# Altium schematic symbol library AD_Lib.SchLib: 1239 symbols (part 6 of 9) (continued)
## Q_BCX70K (continued)
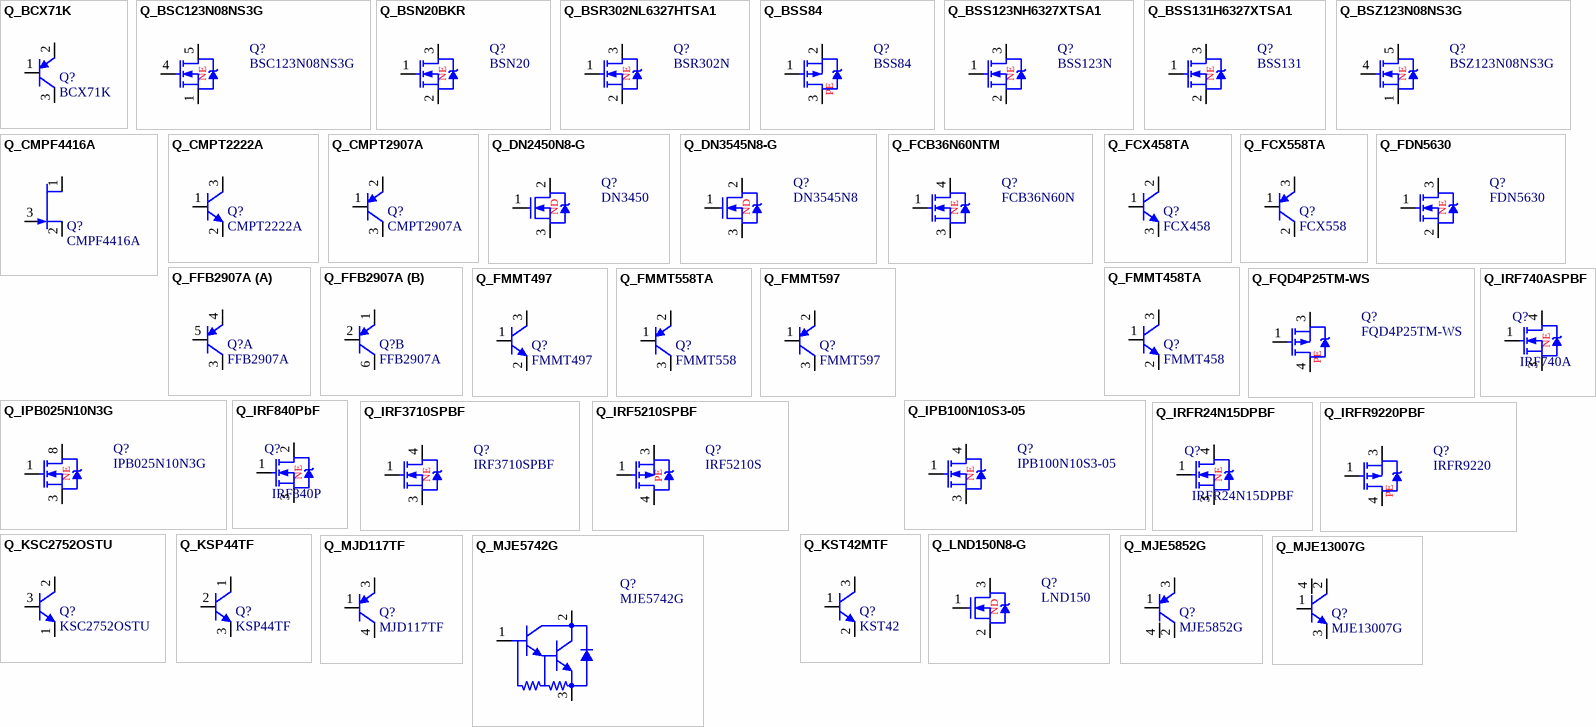
[diagram p27: symbols Q_BCX71K to Q_MJE13007G]

## Q_BCX71K
designator Q?, comment BCX71K
Èý¼«¹Ü,PNP,0.5A,45V; Manufacturer: Fairchild; pro-environment: RoHS; Quality: -55~150¡æ; SN: 03.4.22.17.51CX7101S; other: MARK=BK; PadsNum: 0; Value: PNP,0.5A,45V; OPN: BCX71K; Part: BCX71K; Category: Èý¼«¹Ü; QTY: 3000; Price: ?; OPN_JLC: MMBT5401; SN_JLC: C8326; Price_JLC: 0
footprint SOT23-3 (SOT-23; 3 Leads; Body 3.0 x 2.5 mm, inc. leads (LxW max))
pins: 1 B, 2 E, 3 C

## Q_BSC123N08NS3G
designator Q?, comment BSC123N08NS3G
MOS¹Ü;NE;10A;80V;10.3m¦¸; Manufacturer: Infineon; pro-environment: RoHS; Quality: -55~150¡æ; Value: NE,11A,80V; PadsNum: 5; SN: SN; OPN: BSC123N08NS3G; Part: BSC123N08NS3G; Category: MOS¹Ü; QTY: 1000; Price: 3.65; OPN_JLC: BSC123N08NS3G; SN_JLC: C412732; Price_JLC: 3.65
footprint Q_BSC123N08NS3G (Footprint not found)
pins: 1 S, 2 S, 3 S, 4 G, 5 D, 6 D, 7 D, 8 D, 9 D
text: NE

## Q_BSN20BKR
designator Q?, comment BSN20
MOS; NE; 0.26A; 60V; 2.8¦¸; Manufacturer: Nexperia; pro-environment: RoHS; Quality: -55~150¡æ; Value: NE,0.26A,60V; OPN: BSN20BKR; PadsNum: 0; SN: SN; Part: BSN20; Category: MOS¹Ü; QTY: 3000; Price: 0.53352; OPN_JLC: OPN_JLC; SN_JLC: SN_JLC; Price_JLC: 0
footprint SOT23-3 (SOT-23; 3 Leads; Body 3.0 x 2.5 mm, inc. leads (LxW max))
pins: 1 G, 2 S, 3 D
text: NE

## Q_BSR302NL6327HTSA1
designator Q?, comment BSR302N
MOS; NE; 3.7A; 30V; 18m¦¸; Manufacturer: Nexperia; pro-environment: RoHS; Quality: -55~150¡æ; Value: NE,3.7A,30V; OPN: BSR302NL6327HTSA1; PadsNum: 0; SN: SN; Part: BSR302N; Category: MOS¹Ü; QTY: 3000; Price: 1.1817; OPN_JLC: OPN_JLC; SN_JLC: SN_JLC; Price_JLC: 0
footprint SOT23-3 (SOT-23; 3 Leads; Body 3.0 x 2.5 mm, inc. leads (LxW max))
pins: 1 G, 2 S, 3 D
text: NE

## Q_BSS84
designator Q?, comment BSS84
MOS; PE; 0.13mA; 50V; Manufacturer: ONSEMI; pro-environment: RoHS; Quality: -55~150°C; Value: PE,0.13mA,50V; PadsNum: 0; SN: SN; OPN: BSS84; Part: BSS84; Category: MOSFET; QTY: 3000; OPN_JLC: OPN_JLC; Price_JLC: 0
footprint SOT23-3 (SOT-23; 3 Leads; Body 3.0 x 2.5 mm, inc. leads (LxW max))
pins: 1 G, 2 S, 3 D
text: PE

## Q_BSS123NH6327XTSA1
designator Q?, comment BSS123N
MOS; NE; Manufacturer: Infineon; pro-environment: RoHS; Quality: -55~150¡æ; SN: 03.4.24.21.51S12301S; Value: NE,0.19A,100V; OPN: BSS123NH6327XTSA1; PadsNum: 0; Part: BSS123N; Category: MOS¹Ü; QTY: 3000; Price: 0.30069; OPN_JLC: OPN_JLC; SN_JLC: SN_JLC; Price_JLC: 0
footprint SOT23-3 (SOT-23; 3 Leads; Body 3.0 x 2.5 mm, inc. leads (LxW max))
pins: 1 G, 2 S, 3 D
text: NE

## Q_BSS131H6327XTSA1
designator Q?, comment BSS131
MOS; NE; Manufacturer: Infineon; pro-environment: RoHS; Quality: -55~150¡æ; Value: NE,0.1A,240V; OPN: BSS131H6327XTSA1; PadsNum: 0; SN: SN; Part: BSS131; Category: MOS¹Ü; QTY: 3000; Price: ?; OPN_JLC: OPN_JLC; SN_JLC: SN_JLC; Price_JLC: 0
footprint SOT23-3 (SOT-23; 3 Leads; Body 3.0 x 2.5 mm, inc. leads (LxW max))
pins: 1 G, 2 S, 3 D
text: NE

## Q_BSZ123N08NS3G
designator Q?, comment BSZ123N08NS3G
MOS¹Ü;NE;10A;80V;10.3m¦¸; Manufacturer: Infineon; pro-environment: RoHS; Quality: -55~150¡æ; Value: NE,10A,80V; PadsNum: 5; SN: SN; OPN: BSZ123N08NS3G; Part: BSZ123N08NS3G; Category: MOS¹Ü; QTY: 1000; Price: 4.1923
footprint PG-TDSON-8 (Footprint not found)
pins: 1 S, 2 S, 3 S, 4 G, 5 D, 6 D, 7 D, 8 D
text: NE

## Q_CMPF4416A
designator Q?, comment CMPF4416A
JFET; N; Manufacturer: Central Semiconductor; pro-environment: RoHS; Quality: -55~150¡æ; SN: 03.4.24.21.48441601S; Value: JFET_N,15mA,35V; other: MARK=6BG; PadsNum: 0; OPN: CMPF4416A; Part: CMPF4416A; Category: JFET; QTY: 3000; Price: ?; OPN_JLC: OPN_JLC; SN_JLC: SN_JLC; Price_JLC: 0
footprint SOT23-3 (SOT-23; 3 Leads; Body 3.0 x 2.5 mm, inc. leads (LxW max))
pins: 1 D, 2 S, 3 G

## Q_CMPT2222A
designator Q?, comment CMPT2222A
BJT; NPN; 0.1A; 40V; Manufacturer: Central Semiconductor; pro-environment: RoHS; Quality: -65~155¡æ; Value: NPN,0.1A,40V; other: MARK=C1P; PadsNum: 0; SN: SN; OPN: CMPT2222A; Part: CMPT2222A; Category: Èý¼«¹Ü; QTY: 3000; Price: ?; OPN_JLC: OPN_JLC; SN_JLC: SN_JLC; Price_JLC: 0
footprint SOT23-3 (SOT-23; 3 Leads; Body 3.0 x 2.5 mm, inc. leads (LxW max))
pins: 1 B, 2 E, 3 C

## Q_CMPT2907A
designator Q?, comment CMPT2907A
Èý¼«¹Ü,PNP,0.6A,60V; Manufacturer: Central Semiconductor; pro-environment: RoHS; Quality: -65~150¡æ; other: MARK=C2F; PadsNum: 0; SN: SN; Value: PNP,0.6A,60V; OPN: CMPT2907A; Part: CMPT2907A; Category: Èý¼«¹Ü; QTY: 3000; Price: 2.0826; OPN_JLC: OPN_JLC; SN_JLC: SN_JLC; Price_JLC: 0
footprint SOT23-3 (SOT-23; 3 Leads; Body 3.0 x 2.5 mm, inc. leads (LxW max))
pins: 1 B, 2 E, 3 C

## Q_DN2450N8-G
designator Q?, comment DN3450
MOS; ND; 500V; 0.16A; Manufacturer: Microchip; pro-environment: RoHS; Quality: -55~150¡æ; Value: ND,160mA,500V; OPN: DN2450N8-G; PadsNum: 4; SN: SN; Category: MOS¹Ü; Part: DN3450; QTY: 2000; Price: ?; OPN_JLC: DN2450N8-G; SN_JLC: C616346; Price_JLC: 0
footprint SOT89-3 (SOT89, 3-Leads, Body 4.5x2.4 mm, Pitch 1.5mm, Lead Span 4.1mm, IPC Medium Density)
pins: 1 G, 2 D, 3 S
text: ND

## Q_DN3545N8-G
designator Q?, comment DN3545N8
MOS; ND; 450V; 0.2A; Manufacturer: Microchip; pro-environment: RoHS; Quality: -55~150¡æ; Value: ND,0.2A,450V; OPN: DN3545N8-G; other: Rgs=-1.5V~-3.5V;Rds=20; PadsNum: 0; SN: SN; Part: DN3545N8; Category: MOS¹Ü; QTY: 2000; Price: ?; OPN_JLC: OPN_JLC; SN_JLC: SN_JLC; Price_JLC: 0
footprint SOT89-3 (SOT89, 3-Leads, Body 4.5x2.4 mm, Pitch 1.5mm, Lead Span 4.1mm, IPC Medium Density)
pins: 1 G, 2 D, 3 S
text: ND

## Q_FCB36N60NTM
designator Q?, comment FCB36N60N
MOS¹Ü;NE; Manufacturer: Fairchild; pro-environment: RoHS; Quality: -55~175¡æ; SN: 03.4.24.21.99FCB301S; Value: NE,57A,100V; OPN: FCB36N60NTM; PadsNum: 0; Part: FCB36N60N; Category: MOS¹Ü; QTY: 800; Price: 35.1117; OPN_JLC: OPN_JLC; SN_JLC: SN_JLC; Price_JLC: 0
footprint TO263-3 (D2-PAK, 4-Leads, Body 9.3x10.2mm, Pitch 2.54mm, Lead Span 15.2mm, IPC Low Density)
pins: 1 G, 3 S, 4 D
text: NE

## Q_FCX458TA
designator Q?, comment FCX458
Èý¼«¹Ü,NPN,0.225A,400V; Manufacturer: Diodes Incorporated; pro-environment: RoHS; Quality: -65~150¡æ; OPN: FCX458TA; other: MARK=N58; PadsNum: 0; SN: SN; Value: NPN,0.225A,400V; Part: FCX458; Category: Èý¼«¹Ü; QTY: 1000; Price: ?; OPN_JLC: OPN_JLC; SN_JLC: SN_JLC; Price_JLC: 0
footprint SOT89-3 (SOT89, 3-Leads, Body 4.5x2.4 mm, Pitch 1.5mm, Lead Span 4.1mm, IPC Medium Density)
pins: 1 B, 2 C, 3 E

## Q_FCX558TA
designator Q?, comment FCX558
Èý¼«¹Ü,PNP,0.2A,400V; Manufacturer: Fairchild; pro-environment: RoHS; Quality: -55~150¡æ; OPN: FCX558TA; other: MARK=BK; PadsNum: 0; SN: SN; Value: PNP,0.2A,400V; Part: FCX558; Category: Èý¼«¹Ü; QTY: 1000; Price: ?; OPN_JLC: OPN_JLC; SN_JLC: SN_JLC; Price_JLC: 0
footprint SOT89-3 (SOT89, 3-Leads, Body 4.5x2.4 mm, Pitch 1.5mm, Lead Span 4.1mm, IPC Medium Density)
pins: 1 B, 2 C, 3 E

## Q_FDN5630
designator Q?, comment FDN5630
MOS, 1.7A 60V; Manufacturer: Fairchild; pro-environment: RoHS; Quality: -55~150°C; Value: NE,1.7A,60V; PadsNum: 0; OPN: FDN5630; Part: FDN5630; Category: MOSFET; QTY: 3000; Price: ?; OPN_JLC: OPN_JLC; SN_JLC: SN_JLC; Price_JLC: 0
footprint SOT23-3 (SOT-23; 3 Leads; Body 3.0 x 2.5 mm, inc. leads (LxW max))
pins: 1 G, 2 S, 3 D
text: NE

## Q_FFB2907A
designator Q?, comment FFB2907A
Èý¼«¹Ü,PNP,2P,0.5A,60V; Manufacturer: Fairchild; pro-environment: RoHS; Quality: -55~150¡æ; SN: 03.4.22.11.38290701S; Value: PNP,0.5A,60V; other: MARK=.2F; PadsNum: 0; OPN: FFB2907A; Part: FFB2907A; Category: Èý¼«¹Ü; QTY: 3000; Price: ?; OPN_JLC: OPN_JLC; SN_JLC: SN_JLC; Price_JLC: 0
footprint SC70-LT6 (SOT363, 6-Leads, Body 2x1.3mm, Pitch 0.65mm, Lead Span 2.1mm, IPC Low Density)
part A pins: 3 C, 4 E, 5 B
part B pins: 1 E, 2 B, 6 C

## Q_FMMT458TA
designator Q?, comment FMMT458
Èý¼«¹Ü,NPN,0.225A,400V; Manufacturer: Diodes Incorporated; pro-environment: RoHS; Quality: -55~150¡æ; OPN: FMMT458TA; other: MARK=458; PadsNum: 0; SN: SN; Value: NPN,0.225A,400V; Part: FMMT458; Category: Èý¼«¹Ü; QTY: 3000; Price: ?; OPN_JLC: OPN_JLC; SN_JLC: SN_JLC; Price_JLC: 0
footprint SOT23-3 (SOT-23; 3 Leads; Body 3.0 x 2.5 mm, inc. leads (LxW max))
pins: 1 B, 2 E, 3 C

## Q_FMMT497
designator Q?, comment FMMT497
Èý¼«¹Ü,NPN,0.5A,300V; Manufacturer: ZETEX; pro-environment: RoHS; Quality: -65~125¡æ; SN: 03.4.22.17.51PMMT02S; PadsNum: 0; Value: NPN,0.5A,300V; OPN: FMMT497; Part: FMMT497; Category: Èý¼«¹Ü; QTY: 3000; Price: ?; OPN_JLC: OPN_JLC; SN_JLC: SN_JLC; Price_JLC: 0
footprint SOT23-3 (SOT-23; 3 Leads; Body 3.0 x 2.5 mm, inc. leads (LxW max))
pins: 1 B, 2 E, 3 C

## Q_FMMT558TA
designator Q?, comment FMMT558
Èý¼«¹Ü,PNP,0.15A,400V; Manufacturer: Diodes Incorporated; pro-environment: RoHS; Quality: -55~150¡æ; OPN: FMMT558TA; other: MARK=N58; PadsNum: 0; SN: SN; Value: PNP,0.15A,400V; Part: FMMT558; Category: Èý¼«¹Ü; QTY: 3000; Price: ?; OPN_JLC: OPN_JLC; SN_JLC: SN_JLC; Price_JLC: 0
footprint SOT23-3 (SOT-23; 3 Leads; Body 3.0 x 2.5 mm, inc. leads (LxW max))
pins: 1 B, 2 E, 3 C

## Q_FMMT597
designator Q?, comment FMMT597
Èý¼«¹Ü,PNP,0.2A,300V; Manufacturer: ZETEX; pro-environment: RoHS; Quality: -55~150¡æ; SN: 03.4.22.17.51PMMT01S; PadsNum: 0; Value: PNP,0.2A,300V; OPN: FMMT597; Part: FMMT597; Category: Èý¼«¹Ü; QTY: 3000; Price: ?; OPN_JLC: OPN_JLC; SN_JLC: SN_JLC; Price_JLC: 0
footprint SOT23-3 (SOT-23; 3 Leads; Body 3.0 x 2.5 mm, inc. leads (LxW max))
pins: 1 B, 2 E, 3 C

## Q_FQD4P25TM-WS
designator Q?, comment FQD4P25TM-WS
MOS; PE; 400V ; 3.1A; Manufacturer: Fairchild; pro-environment: RoHS; Quality: -55~150¡æ; Value: PE,3.1A,250V; PadsNum: 0; SN: SN; OPN: FQD4P25TM-WS; Part: FQD4P25TM-WS; Category: MOS¹Ü; QTY: 2500; Price: 3.0171; OPN_JLC: OPN_JLC; SN_JLC: SN_JLC; Price_JLC: 0
footprint TO252-3 (D-PAK, 4-Leads, Body 6.1x6.5mm, Pitch 2.28mm, Lead Span 9.8mm, IPC Low Density)
pins: 1 G, 3 S, 4 D
text: PE

## Q_IPB025N10N3G
designator Q?, comment IPB025N10N3G
MOS¹Ü;NE;100A;100V; Manufacturer: Infineon; pro-environment: RoHS; Quality: -55~175¡æ; SN: 03.4.24.21.33100N01S; Value: NE,100A,100V; PadsNum: 0; OPN: IPB025N10N3G; Part: IPB025N10N3G; Category: MOS¹Ü; QTY: 1000; Price: 11.934; OPN_JLC: OPN_JLC; SN_JLC: SN_JLC; Price_JLC: 0
footprint TO263-3 (D2-PAK, 4-Leads, Body 9.3x10.2mm, Pitch 2.54mm, Lead Span 15.2mm, IPC Low Density)
pins: 1 G, 2 S, 3 S, 5 S, 6 S, 7 S, 8 D
text: NE

## Q_IPB100N10S3-05
designator Q?, comment IPB100N10S3-05
MOS¹Ü;NE;100A;100V; Manufacturer: Infineon; pro-environment: RoHS; Quality: -55~175¡æ; SN: 03.4.24.21.33100N01S; Value: NE,100A,100V; PadsNum: 0; OPN: IPB100N10S3-05; Part: IPB100N10S3-05; Category: MOS¹Ü; QTY: 1000; Price: 11.934; OPN_JLC: OPN_JLC; SN_JLC: SN_JLC; Price_JLC: 0
footprint TO263-3 (D2-PAK, 4-Leads, Body 9.3x10.2mm, Pitch 2.54mm, Lead Span 15.2mm, IPC Low Density)
pins: 1 G, 3 S, 4 D
text: NE

## Q_IRF740ASPBF
designator Q?, comment IRF740A
MOS¹Ü;NE;10A;400V; Manufacturer: Vishay; pro-environment: RoHS; Quality: -55~150¡æ; SN: 03.4.24.21.33F74001S; Value: NE,10A,400V; OPN: IRF740ASPBF; PadsNum: 0; Part: IRF740A; Category: MOSFET; QTY: 1000; Price: 7.2072; OPN_JLC: OPN_JLC; SN_JLC: SN_JLC; Price_JLC: 0
footprint TO263-3 (D2-PAK, 4-Leads, Body 9.3x10.2mm, Pitch 2.54mm, Lead Span 15.2mm, IPC Low Density)
pins: 1 G, 3 S, 4 D
text: NE

## Q_IRF840PbF
designator Q?, comment IRF840P
MOS; NE; 8A; 500V; Manufacturer: Vishay; pro-environment: RoHS; Quality: -55~150¡æ; SN: 03.4.24.21.31F84001S; Value: NE,8A,500V; OPN: IRF840PbF; PadsNum: 0; Part: IRF840P; Category: MOS¹Ü; QTY: 1000; Price: ?; OPN_JLC: OPN_JLC; SN_JLC: SN_JLC; Price_JLC: 0
footprint TO220-3 (TO, Thru-Hole, Vertical, Heatsink Mounted; 3 In-Line Leads; Pitch 2.54 mm)
pins: 1 G, 2 D, 3 S
text: NE

## Q_IRF3710SPBF
designator Q?, comment IRF3710SPBF
MOS¹Ü;NE;57A;100V; Manufacturer: Infineon; pro-environment: RoHS; Quality: -55~175¡æ; Value: NE,57A,100V; PadsNum: 0; SN: SN; OPN: IRF3710SPBF; Part: IRF3710SPBF; Category: MOS¹Ü; QTY: 50; Price: 7.5465; OPN_JLC: OPN_JLC; SN_JLC: SN_JLC; Price_JLC: 0
footprint TO263-3 (D2-PAK, 4-Leads, Body 9.3x10.2mm, Pitch 2.54mm, Lead Span 15.2mm, IPC Low Density)
pins: 1 G, 3 S, 4 D
text: NE

## Q_IRF5210SPBF
designator Q?, comment IRF5210S
MOS; PE; 40A; 100V; Manufacturer: Infineon; pro-environment: RoHS; Quality: -55~150¡æ; Value: PE,40A,100V; OPN: IRF5210SPBF; other: Rds=60m¦¸;Vgs=20V;Pd=3.8W; PadsNum: 0; SN: SN; Category: MOS¹Ü; Part: IRF5210S; QTY: 50; Price: ?; OPN_JLC: OPN_JLC; SN_JLC: SN_JLC; Price_JLC: 0
footprint TO263-3 (D2-PAK, 4-Leads, Body 9.3x10.2mm, Pitch 2.54mm, Lead Span 15.2mm, IPC Low Density)
pins: 1 G, 3 S, 4 D
text: PE

## Q_IRFR24N15DPBF
designator Q?, comment IRFR24N15DPBF
MOS¹Ü;NE;24A;150V; Manufacturer: Infineon; pro-environment: RoHS; Quality: -55~175¡æ; Value: NE,24A,150V; PadsNum: 0; SN: SN; OPN: IRFR24N15DPBF; Part: IRFR24N15DPBF; Category: ¹¦ÂÊMOSFET; QTY: 75; Price: 0; OPN_JLC: IRFR24N15DPBF; SN_JLC: C151495; Price_JLC: 7.55
footprint TO252-3 (D-PAK, 4-Leads, Body 6.1x6.5mm, Pitch 2.28mm, Lead Span 9.8mm, IPC Low Density)
pins: 1 G, 3 S, 4 D
text: NE

## Q_IRFR9220PBF
designator Q?, comment IRFR9220
MOS; PE; 200V ; 3.6A; Manufacturer: Vishay; pro-environment: RoHS; Quality: -55~150¡æ; Value: PE,3.6A,200V; OPN: IRFR9220PBF; PadsNum: 3; SN: SN; Part: IRFR9220; Category: MOS¹Ü; QTY: 75; Price: 11.4243; OPN_JLC: IRFR9120TRPBF; SN_JLC: SN_JLC; Price_JLC: 5.75
footprint TO252-3 (D-PAK, 4-Leads, Body 6.1x6.5mm, Pitch 2.28mm, Lead Span 9.8mm, IPC Low Density)
pins: 1 G, 3 S, 4 D
text: PE

## Q_KSC2752OSTU
designator Q?, comment KSC2752OSTU
Èý¼«¹Ü,NPN,0.5A,400V; Manufacturer: Fairchild; pro-environment: RoHS; Quality: -55~150¡æ; SN: 03.4.22.11.99275201S; PadsNum: 0; Value: NPN,0.5A,400V; OPN: KSC2752OSTU; Part: KSC2752OSTU; Category: Èý¼«¹Ü; QTY: 1920; other: NPN,0.5A,400V; Price: 1.2519; OPN_JLC: OPN_JLC; SN_JLC: SN_JLC; Price_JLC: 0
footprint TO126-3 (Footprint not found)
pins: 1 E, 2 C, 3 B

## Q_KSP44TF
designator Q?, comment KSP44TF
Èý¼«¹Ü,NPN,0.3A,400V; Manufacturer: Fairchild; pro-environment: RoHS; Quality: -55~150¡æ; SN: 03.4.22.11.38KSP401S; other: Mark=KSP44; PadsNum: 0; Value: NPN,0.3A,400V; OPN: KSP44TF; Part: KSP44TF; Category: Èý¼«¹Ü; QTY: 2000; Price: 0.58266; OPN_JLC: OPN_JLC; SN_JLC: SN_JLC; Price_JLC: 0
footprint TO-92_B (Íä½Å;)
pins: 1 C, 2 B, 3 E

## Q_KST42MTF
designator Q?, comment KST42
Èý¼«¹Ü,NPN,0.5A,300V; Manufacturer: Fairchild; pro-environment: RoHS; Quality: -40~150¡æ; OPN: KST42MTF; other: Mark = 1D; PadsNum: 0; SN: SN; Value: NPN,0.5A,300V; Part: KST42; Category: Èý¼«¹Ü; QTY: 3000; Price: 0.26676; OPN_JLC: OPN_JLC; SN_JLC: SN_JLC; Price_JLC: 0
footprint SOT23-3 (SOT-23; 3 Leads; Body 3.0 x 2.5 mm, inc. leads (LxW max))
pins: 1 B, 2 E, 3 C

## Q_LND150N8-G
designator Q?, comment LND150
MOS; ND; 30mA; 500V; Manufacturer: Microchip; pro-environment: RoHS; Quality: -55~150¡æ; SN: 03.4.24.21.53D15001S; Value: ND,30mA,500V; OPN: LND150N8-G; PadsNum: 0; Category: MOS¹Ü; Part: LND150; QTY: 2000; Price: ?; OPN_JLC: OPN_JLC; SN_JLC: SN_JLC; Price_JLC: 0
footprint SOT89-3 (SOT89, 3-Leads, Body 4.5x2.4 mm, Pitch 1.5mm, Lead Span 4.1mm, IPC Medium Density)
pins: 1 G, 2 S, 3 D
text: ND

## Q_MJD117TF
designator Q?, comment MJD117TF
Èý¼«¹Ü; PNP; 2A; 100V; Manufacturer: Fairchild; pro-environment: RoHS; Quality: -65~150¡æ; Value: PNP,2A,100V; PadsNum: 3; SN: SN; OPN: MJD117TF; Part: MJD117TF; Category: Èý¼«¹Ü; QTY: 2000; other: PNP,2A,100V; Price: ?; OPN_JLC: MJD117TF; SN_JLC: C157554; Price_JLC: 0.768
footprint TO252-3 (D-PAK, 4-Leads, Body 6.1x6.5mm, Pitch 2.28mm, Lead Span 9.8mm, IPC Low Density)
pins: 1 B, 3 E, 4 C

## Q_MJE5742G
designator Q?, comment MJE5742G
´ïÁÖ¶Ù¹Ü; NPN; 400V; 8A;; Manufacturer: ON; Quality: -55~150¡æ; Value: 8A,400V; PadsNum: 3; SN: SN; OPN: MJE5742G; Part: MJE5742G; Category: ´ïÁÖ¶Ù¹Ü; QTY: 50; Price: 10.8819; OPN_JLC: MJE5742G; SN_JLC: C897093; Price_JLC: 6.83
footprint TO220-3 (TO, Thru-Hole, Vertical, Heatsink Mounted; 3 In-Line Leads; Pitch 2.54 mm)
pins: 1 B, 2 C, 3 E

## Q_MJE5852G
designator Q?, comment MJE5852G
Èý¼«¹Ü,PNP,8A,400V; Manufacturer: ON; pro-environment: RoHS; Quality: -65~150¡æ; SN: 03.4.22.11.38585201S; other: PNP,8A,400V,80W; PadsNum: 0; Value: PNP,8A,400V; OPN: MJE5852G; Part: MJE5852G; Category: Èý¼«¹Ü; QTY: 50; Price: 19.4805; OPN_JLC: OPN_JLC; SN_JLC: SN_JLC; Price_JLC: 0
footprint TO220-3 (TO, Thru-Hole, Vertical, Heatsink Mounted; 3 In-Line Leads; Pitch 2.54 mm)
pins: 1 B, 2 C, 3 E, 4 C

## Q_MJE13007G
designator Q?, comment MJE13007G
Èý¼«¹Ü,NPN,8A,400V; Manufacturer: ON; pro-environment: RoHS; Quality: -65~150¡æ; SN: 03.4.22.11.38130701S; other: NPN,8A,400V,80W; PadsNum: 0; Value: NPN,8A,400V; OPN: MJE13007G; Part: MJE13007G; Category: Èý¼«¹Ü; QTY: 50; Price: 5.9202; OPN_JLC: OPN_JLC; SN_JLC: SN_JLC; Price_JLC: 0
footprint TO220-3 (TO, Thru-Hole, Vertical, Heatsink Mounted; 3 In-Line Leads; Pitch 2.54 mm)
pins: 1 B, 2 C, 3 E, 4 C

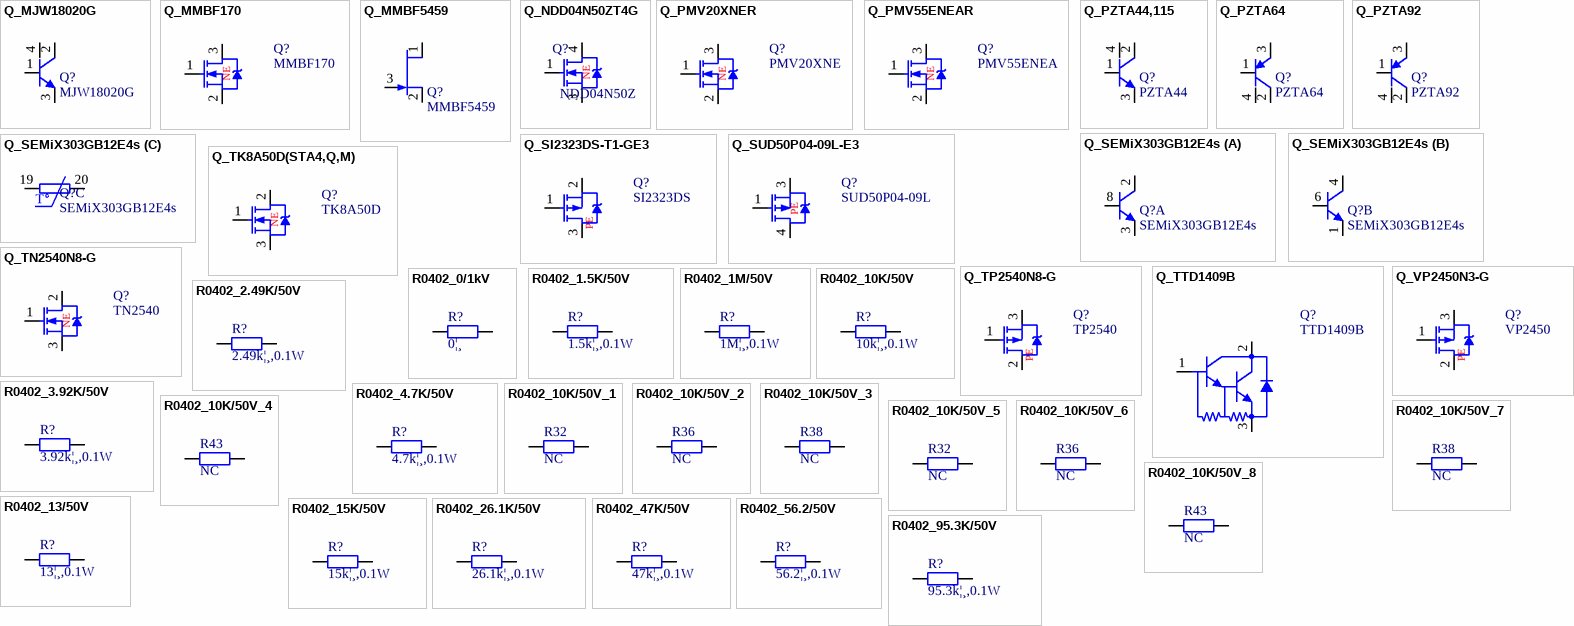
[diagram p28: symbols Q_MJW18020G to R0402_95.3K/50V]

## Q_MJW18020G
designator Q?, comment MJW18020G
Èý¼«¹Ü,NPN,30A,450V; Manufacturer: ON; pro-environment: RoHS; Quality: -65~150¡æ; SN: 03.4.22.11.32180201S; other: NPN,30A,450V,250W; PadsNum: 0; Value: NPN,30A,450V; OPN: MJW18020G; Part: MJW18020G; Category: Èý¼«¹Ü; QTY: 30; Price: 47.2095; OPN_JLC: OPN_JLC; SN_JLC: SN_JLC; Price_JLC: 0
footprint TO247-3_B (Íä½ÅTO, Thru-Hole, Vertical, Heatsink Mounted; 3 In-Line Leads; Pitch 5.45 mm)
pins: 1 B, 2 C, 3 E, 4 C

## Q_MMBF170
designator Q?, comment MMBF170
MOS¹Ü;NE; Manufacturer: Fairchild; pro-environment: RoHS; Quality: -55~150¡æ; SN: 03.4.24.21.48F17001S; Value: NE,0.5A,60V; PadsNum: 0; OPN: MMBF170; Part: MMBF170; Category: MOS¹Ü; QTY: 3000; Price: ?; OPN_JLC: OPN_JLC; SN_JLC: SN_JLC; Price_JLC: 0
footprint SOT23-3 (SOT-23; 3 Leads; Body 3.0 x 2.5 mm, inc. leads (LxW max))
pins: 1 G, 2 S, 3 D
text: NE

## Q_MMBF5459
designator Q?, comment MMBF5459
JFET; N; Manufacturer: Fairchild; pro-environment: RoHS; Quality: -55~150¡æ; Value: JFET_N,13mA,25V; other: MARK=6L; PadsNum: 0; SN: SN; OPN: MMBF5459; Part: MMBF5459; Category: JFET; QTY: 3000; Price: 0.51597; OPN_JLC: OPN_JLC; SN_JLC: SN_JLC; Price_JLC: 0
footprint SOT23-3 (SOT-23; 3 Leads; Body 3.0 x 2.5 mm, inc. leads (LxW max))
pins: 1 D, 2 S, 3 G

## Q_NDD04N50ZT4G
designator Q?, comment NDD04N50Z
MOS¹Ü; NE; 3A; 500V; Manufacturer: ON Semiconductor; pro-environment: RoHS; Quality: -55~175¡æ; Value: NE,3A,500V; OPN: NDD04N50ZT4G; PadsNum: 3; SN: SN; Part: NDD04N50Z; Category: ¹¦ÂÊMOSFET; QTY: 2500; Price: 0; OPN_JLC: NDD04N50ZT4G; SN_JLC: C179606; Price_JLC: 1.036
footprint TO252-3 (D-PAK, 4-Leads, Body 6.1x6.5mm, Pitch 2.28mm, Lead Span 9.8mm, IPC Low Density)
pins: 1 G, 3 S, 4 D
text: NE

## Q_PMV20XNER
designator Q?, comment PMV20XNE
MOS; NE; 7.2A; 30V; 23m¦¸; Manufacturer: Nexperia; pro-environment: RoHS; Quality: -55~150¡æ; Value: NE,7.2A,30V; OPN: PMV20XNER; PadsNum: 0; SN: SN; Part: PMV20XNE; Category: MOS¹Ü; QTY: 3000; Price: 0.81783; OPN_JLC: OPN_JLC; SN_JLC: SN_JLC; Price_JLC: 0
footprint SOT23-3 (SOT-23; 3 Leads; Body 3.0 x 2.5 mm, inc. leads (LxW max))
pins: 1 G, 2 S, 3 D
text: NE

## Q_PMV55ENEAR
designator Q?, comment PMV55ENEA
MOS; NE; 3.1A; 60V; 46m¦¸; Manufacturer: Nexperia; pro-environment: RoHS; Quality: -55~150¡æ; Value: NE,3.1A,60V; OPN: PMV55ENEAR; PadsNum: 0; SN: SN; Part: PMV55ENEA; Category: MOS¹Ü; QTY: 3000; Price: 1.06002; OPN_JLC: OPN_JLC; SN_JLC: SN_JLC; Price_JLC: 0
footprint SOT23-3 (SOT-23; 3 Leads; Body 3.0 x 2.5 mm, inc. leads (LxW max))
pins: 1 G, 2 S, 3 D
text: NE
